# Altium footprint library PCB_Library.PcbLib: 110 footprints (part 6 of 7)
Each footprint in its own frame and in the unit in brackets; x right, y up, seen from the top. Pads: shape width x height; smd on the part's side, far side on the other; paste and mask are expansions set on the pad; w line width, h text height; cw(c..) or ccw(c..) is an arc to the next point about the centre after c.
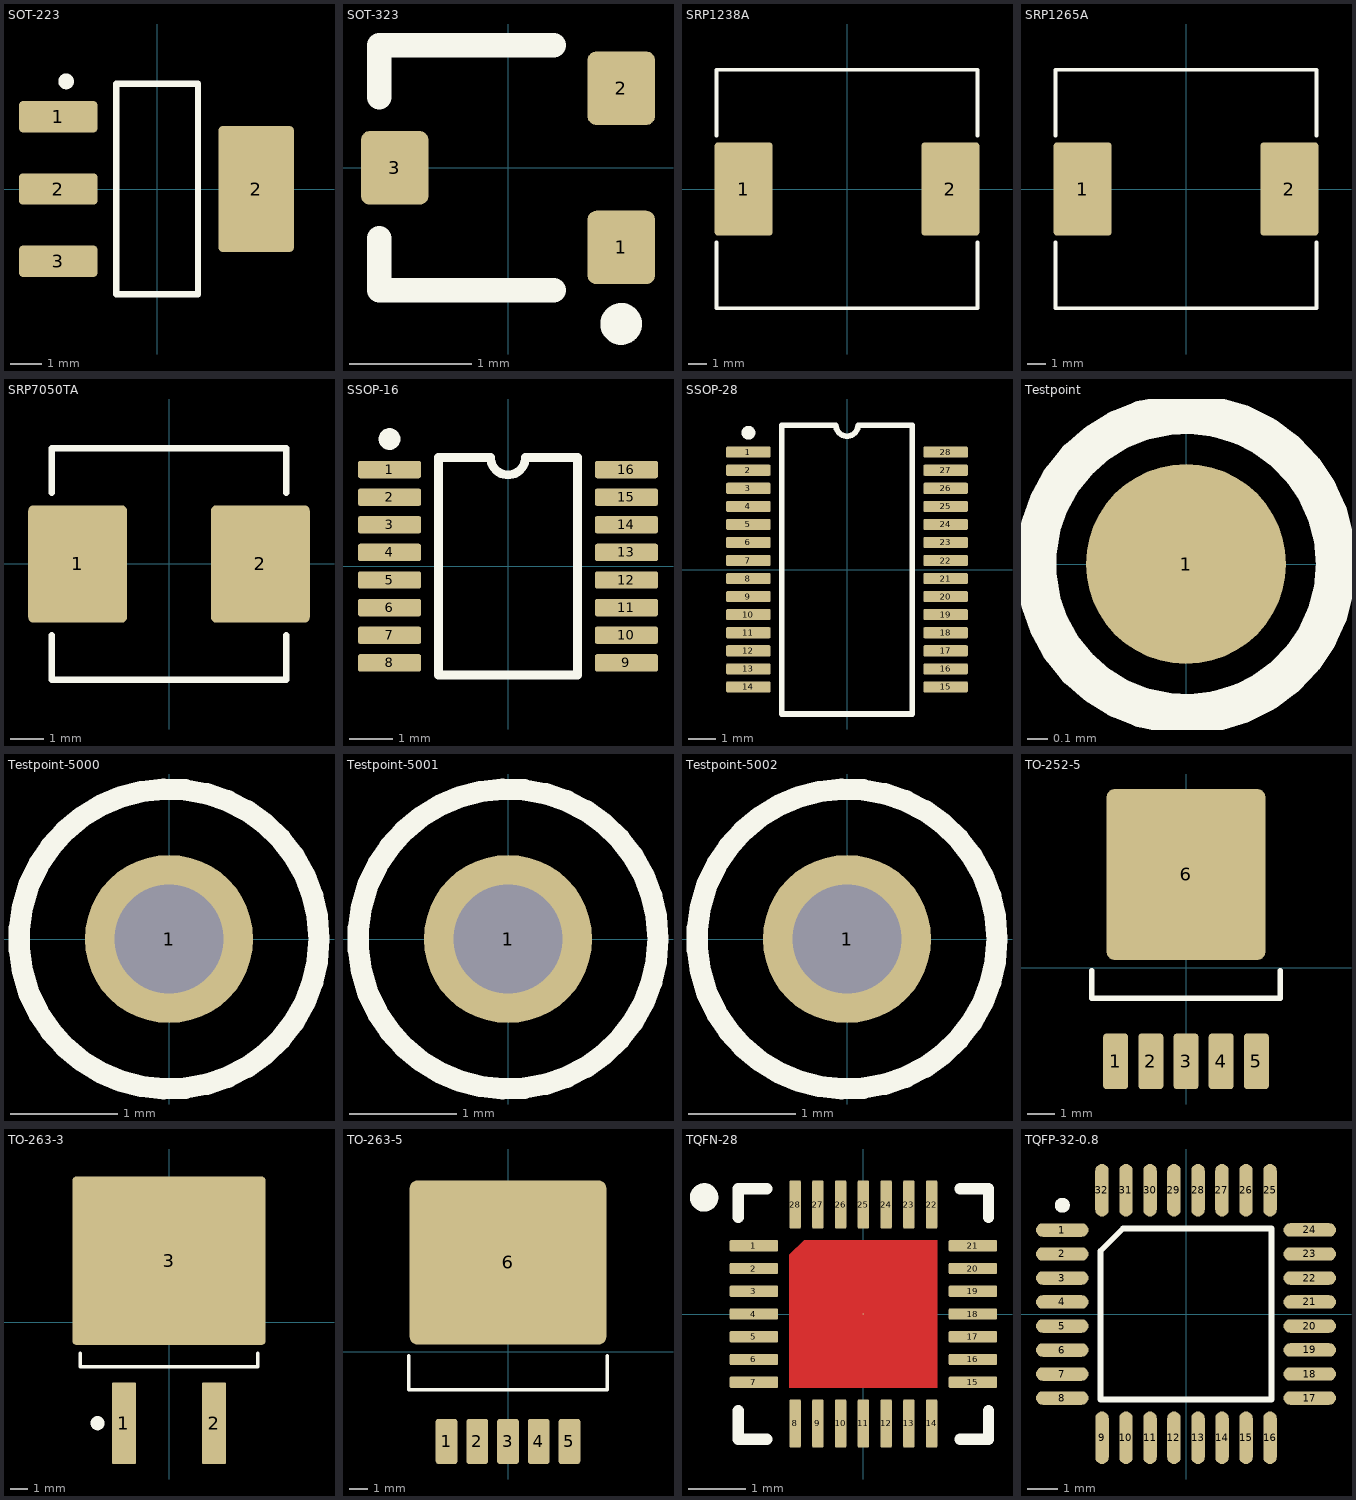
[diagram p5: the footprints below, top view; thin cyan lines are the x and y axes]

## SOT-223 [mm]
height 1.8
pads (4):
  rrect25% 2.5x1 smd paste-0.075 mask+0.05: 1(-3.15,2.3) 2(-3.15,0) 3(-3.15,-2.3)
  rrect10% 2.4x4 smd paste-0.2 mask+0.05: 2(3.15,0)
Top Overlay:
  circle w0.25: c-2.9,3.425 r0.125
  lines w0.2: -1.3,-3.35 -1.3,3.35 1.3,3.35 1.3,-3.35 -1.3,-3.35
3D body "SOT230P700X180-4N.step": height 1.8, standoff 0, extent -3.5,-3.35 3.5,3.35

## SOT-323 [mm]
pads (3):
  rrect25% 0.55x0.6 smd paste-0.03 mask+0.05: 1(0.925,-0.65) 2(0.925,0.65) 3(-0.925,0)
Top Overlay:
  circle w0.2: c0.925,-1.275 r0.071
  lines w0.2: -1.05,-0.575 -1.05,-1 0.375,-1 ; -1.05,0.575 -1.05,1 0.375,1
3D body "User Library-SOT323 (SC70-3)-1.STEP": height 1.1, standoff 0, extent -1.123,-1.1 1.123,1.1

## SRP1238A [mm]
pads (2):
  rrect10% 3.1x5 smd paste-2 mask+0.05: 1(-5.55,0) 2(5.55,0)
Top Overlay:
  lines w0.2: -7,-2.875 -7,-6.4 7,-6.4 7,-2.875 ; -7,2.875 -7,6.4 7,6.4 7,2.875
Top Paste:
  rectangle: 4.2,-2.3 6.9,-0.5
  rectangle: 4.2,0.5 6.9,2.3
  rectangle: -6.9,-2.3 -4.2,-0.5
  rectangle: -6.9,0.5 -4.2,2.3
3D body "Ind_Bourns_SRP1238A-R68M_eec.STEP": height 0.25, standoff 0, extent -7.2,-6.5 7.2,6.5

## SRP1265A [mm]
pads (2):
  rrect10% 3.1x5 smd paste-2 mask+0.05: 1(-5.55,0) 2(5.55,0)
Top Overlay:
  lines w0.2: -7,-2.875 -7,-6.4 7,-6.4 7,-2.875 ; -7,2.875 -7,6.4 7,6.4 7,2.875
Top Paste:
  rectangle: -6.9,0.5 -4.2,2.3
  rectangle: -6.9,-2.3 -4.2,-0.5
  rectangle: 4.2,0.5 6.9,2.3
  rectangle: 4.2,-2.3 6.9,-0.5
3D body "Ind_Bourns_SRP1265A-100M_eec.STEP": height 0.25, standoff 0, extent -7.2,-6.5 7.2,6.5

## SRP7050TA [mm]
pads (2):
  rrect10% 2.95x3.5 smd paste-2 mask+0.05: 1(-2.725,0) 2(2.725,0)
Top Overlay:
  lines w0.2: -3.5,-2.125 -3.5,-3.45 3.5,-3.45 3.5,-2.125 ; -3.5,2.125 -3.5,3.45 3.5,3.45 3.5,2.125
Top Paste:
  rectangle: -4,0.3 -1.5,1.5
  rectangle: -4,-1.5 -1.5,-0.3
  rectangle: 1.5,0.3 4,1.5
  rectangle: 1.5,-1.5 4,-0.3
3D body "Ind_Bourns_SRP7050TA-R68M_eec.STEP": height 0.25, standoff 0, extent -4.3,-3.55 4.3,3.55

## SSOP-16 [mm]
height 1.73
pads (16):
  rrect25% 1.45x0.4 smd paste-0.035 mask+0.05: 1(-2.725,2.222) 2(-2.725,1.587) 3(-2.725,0.953) 4(-2.725,0.318) 5(-2.725,-0.318) 6(-2.725,-0.953) 7(-2.725,-1.587) 8(-2.725,-2.222) 9(2.725,-2.222) 10(2.725,-1.587) 11(2.725,-0.953) 12(2.725,-0.318) 13(2.725,0.318) 14(2.725,0.953) 15(2.725,1.587) 16(2.725,2.222)
Top Overlay:
  circle w0.25: c-2.725,2.925 r0.125
  lines w0.2: -1.6,-2.5 1.6,-2.5 1.6,2.5 0.4,2.5 cw(c0,2.5) -0.4,2.5 -1.6,2.5 -1.6,-2.5
3D body "IC_Analog_Devices_LTC6242HGN#TRPBF_eec.STEP": height 1.75, standoff 0, extent -3.019,-2.445 3.019,2.445

## SSOP-28 [mm]
height 2
pads (28):
  rrect25% 1.6x0.4 smd paste-0.035 mask+0.05: 1(-3.55,4.225) 2(-3.55,3.575) 3(-3.55,2.925) 4(-3.55,2.275) 5(-3.55,1.625) 6(-3.55,0.975) 7(-3.55,0.325) 8(-3.55,-0.325) 9(-3.55,-0.975) 10(-3.55,-1.625) 11(-3.55,-2.275) 12(-3.55,-2.925) 13(-3.55,-3.575) 14(-3.55,-4.225) 15(3.55,-4.225) 16(3.55,-3.575) 17(3.55,-2.925) 18(3.55,-2.275) 19(3.55,-1.625) 20(3.55,-0.975) 21(3.55,-0.325) 22(3.55,0.325) 23(3.55,0.975) 24(3.55,1.625) 25(3.55,2.275) 26(3.55,2.925) 27(3.55,3.575) 28(3.55,4.225)
Top Overlay:
  circle w0.25: c-3.55,4.925 r0.125
  lines w0.2: -2.35,-5.2 -2.35,5.2 -0.4,5.2 ccw(c0,5.2) 0.4,5.2 2.35,5.2 2.35,-5.2 -2.35,-5.2
3D body "User Library-SSOP-28-FT232RL.step": height 2.16, standoff 0, extent -3.878,-5.165 3.878,5.165

## Testpoint [mm]
pads (1):
  round 1 smd paste-1 mask+0.05: 1(0,0)
Top Overlay:
  circle w0.2: c0,0 r0.75

## Testpoint-5000 [mm] "534-5000 -- RED"
pads (1):
  round 1.57 hole 1.02 mask+0.05: 1(0,0)
Top Overlay:
  circle w0.2: c0,0 r1.4
Top Courtyard:
  lines w0.1: -0.5,0 0.5,0 ; 0,-0.5 0,0.5
3D body "User Library-TEST POINT RED Keystone 5000.step": height 4.88, standoff -3.07, extent -1.27,-1.261 1.27,1.261

## Testpoint-5001 [mm] "534-5001 -- Black"
pads (1):
  round 1.57 hole 1.02 mask+0.05: 1(0,0)
Top Overlay:
  circle w0.2: c0,0 r1.4
Top Courtyard:
  lines w0.1: -0.5,0 0.5,0 ; 0,-0.5 0,0.5
3D body "User Library-TEST POINT BLK Keystone 5001.step": height 4.88, standoff -3.07, extent -1.27,-1.261 1.27,1.261

## Testpoint-5002 [mm] "534-5002 -- White"
pads (1):
  round 1.57 hole 1.02 mask+0.05: 1(0,0)
Top Overlay:
  circle w0.2: c0,0 r1.4
Top Courtyard:
  lines w0.1: -0.5,0 0.5,0 ; 0,-0.5 0,0.5
3D body "User Library-TEST POINT WHT Keystone 5002.step": height 4.88, standoff -3.07, extent -1.27,-1.261 1.27,1.261

## TO-252-5 [mm]
pads (6):
  rrect25% 0.9x2 smd paste-0.05 mask+0.05: 1(-2.54,-3.372) 2(-1.27,-3.372) 3(0,-3.372) 4(1.27,-3.372) 5(2.54,-3.372)
  rrect10% 5.73x6.17 smd paste-3 mask+0.05: 6(0,3.373)
Top Overlay:
  lines w0.2: -3.4,-0.1 -3.4,-1.1 3.4,-1.1 3.4,-0.1
Top Paste:
  rectangle: -2.5,3.75 -0.5,6
  rectangle: 0.5,3.75 2.5,6
  rectangle: -2.5,0.75 -0.5,3
  rectangle: 0.5,0.75 2.5,3
3D body "User Library-DPAK-5.step": height 2.4, standoff 0, extent -3.35,-4.099 3.35,6.2

## TO-263-3 [mm]
pads (3):
  rrect10% 1.35x4.6 smd paste-0.05 mask+0.05: 1(-2.54,-5.675) 2(2.54,-5.675)
  rrect5% 10.9x9.5 smd paste-10 mask+0.05: 3(0,3.475)
Top Overlay:
  circle w0.4: c-4.025,-5.675 r0.2
  lines w0.2: -5,-1.75 -5,-2.5 5,-2.5 5,-1.75
Top Paste:
  rectangle: 0.15,3.625 5.35,8.125
  rectangle: -5.35,3.625 -0.15,8.125
  rectangle: -5.35,-1.175 -0.15,3.325
  rectangle: 0.15,-1.175 5.35,3.325
3D body "Infineon-STP_PG-TO263-3-2-P-v01_00-EN.stp": height 4.41, standoff -0.1, extent -5,-7.23 5,7.72

## TO-263-5 [mm]
pads (6):
  rrect25% 1.2x2.5 smd paste-0.05 mask+0.05: 1(-3.4,-4.95) 2(-1.7,-4.95) 3(0,-4.95) 4(1.7,-4.95) 5(3.4,-4.95)
  rrect10% 10.9x9.1 smd paste-5 mask+0.05: 6(0,4.95)
Top Overlay:
  lines w0.2: -5.5,-0.2 -5.5,-2.1 5.5,-2.1 5.5,-0.2
Top Paste:
  rectangle: -4.75,5.5 -2.25,9
  rectangle: -1.25,5.5 1.25,9
  rectangle: 2.25,5.5 4.75,9
  rectangle: -4.75,1 -2.25,4.5
  rectangle: -1.25,1 1.25,4.5
  rectangle: 2.25,1 4.75,4.5
3D body "User Library-TO-263BA-1.step": height 4.38, standoff 0, extent -5.112,-5.777 5.112,8.269

## TQFN-28 [mm]
height 0.8
pads (29):
  rrect25% 0.85x0.2 smd paste-0.02 mask+0.05: 1(-1.925,1.2) 2(-1.925,0.8) 3(-1.925,0.4) 4(-1.925,0) 5(-1.925,-0.4) 6(-1.925,-0.8) 7(-1.925,-1.2) 15(1.925,-1.2) 16(1.925,-0.8) 17(1.925,-0.4) 18(1.925,0) 19(1.925,0.4) 20(1.925,0.8) 21(1.925,1.2)
  rrect25% 0.2x0.85 smd paste-0.02 mask+0.05: 8(-1.2,-1.925) 9(-0.8,-1.925) 10(-0.4,-1.925) 11(0,-1.925) 12(0.4,-1.925) 13(0.8,-1.925) 14(1.2,-1.925) 22(1.2,1.925) 23(0.8,1.925) 24(0.4,1.925) 25(0,1.925) 26(-0.4,1.925) 27(-0.8,1.925) 28(-1.2,1.925)
  round 0.025 smd paste-5 mask+0.05: 29(0,0)
Top Layer:
  region: 1.3,-1.3 -1.3,-1.3 -1.3,1.04 -1.04,1.3 1.3,1.3
Top Overlay:
  circle w0.25: c-2.8,2.05 r0.125
  lines w0.2: -2.2,-1.7 -2.2,-2.2 -1.7,-2.2 ; -2.2,1.7 -2.2,2.2 -1.7,2.2 ; 1.7,-2.2 2.2,-2.2 2.2,-1.7 ; 1.7,2.2 2.2,2.2 2.2,1.7
Top Paste:
  rectangle: -1,0.5 -0.5,1
  rectangle: -1,-0.25 -0.5,0.25
  rectangle: -1,-1 -0.5,-0.5
  rectangle: -0.25,0.5 0.25,1
  rectangle: -0.25,-0.25 0.25,0.25
  rectangle: -0.25,-1 0.25,-0.5
  rectangle: 0.5,0.5 1,1
  rectangle: 0.5,-0.25 1,0.25
  rectangle: 0.5,-1 1,-0.5
3D body "IC_Maxim_Integrated_MAX31790ATI+_eec.STEP": height 0.8, standoff 0, extent -2.01,-2.01 2.01,2.01

## TQFP-32-0.8 [mm]
height 1.2
pads (32):
  oval 1.75x0.45 smd paste-0.075 mask+0.05: 1(-4.125,2.8) 2(-4.125,2) 3(-4.125,1.2) 4(-4.125,0.4) 5(-4.125,-0.4) 6(-4.125,-1.2) 7(-4.125,-2) 8(-4.125,-2.8) 17(4.125,-2.8) 18(4.125,-2) 19(4.125,-1.2) 20(4.125,-0.4) 21(4.125,0.4) 22(4.125,1.2) 23(4.125,2) 24(4.125,2.8)
  oval 0.45x1.75 smd paste-0.075 mask+0.05: 9(-2.8,-4.125) 10(-2,-4.125) 11(-1.2,-4.125) 12(-0.4,-4.125) 13(0.4,-4.125) 14(1.2,-4.125) 15(2,-4.125) 16(2.8,-4.125) 25(2.8,4.125) 26(2,4.125) 27(1.2,4.125) 28(0.4,4.125) 29(-0.4,4.125) 30(-1.2,4.125) 31(-2,4.125) 32(-2.8,4.125)
Top Overlay:
  circle w0.25: c-4.125,3.625 r0.125
  lines w0.2: -2.85,-2.85 2.85,-2.85 2.85,2.85 -2.1,2.85 -2.85,2.1 -2.85,-2.85
3D body "TQFP80P900X900X120-32N.step": height 1.2, standoff 0, extent -4.5,-4.5 4.5,4.5